# Altium footprint library connectors.PcbLib: 256 footprints (part 15 of 16)
Each footprint in its own frame and in the unit in brackets; x right, y up, seen from the top. Pads: shape width x height; smd on the part's side, far side on the other; paste and mask are expansions set on the pad; w line width, h text height; cw(c..) or ccw(c..) is an arc to the next point about the centre after c.
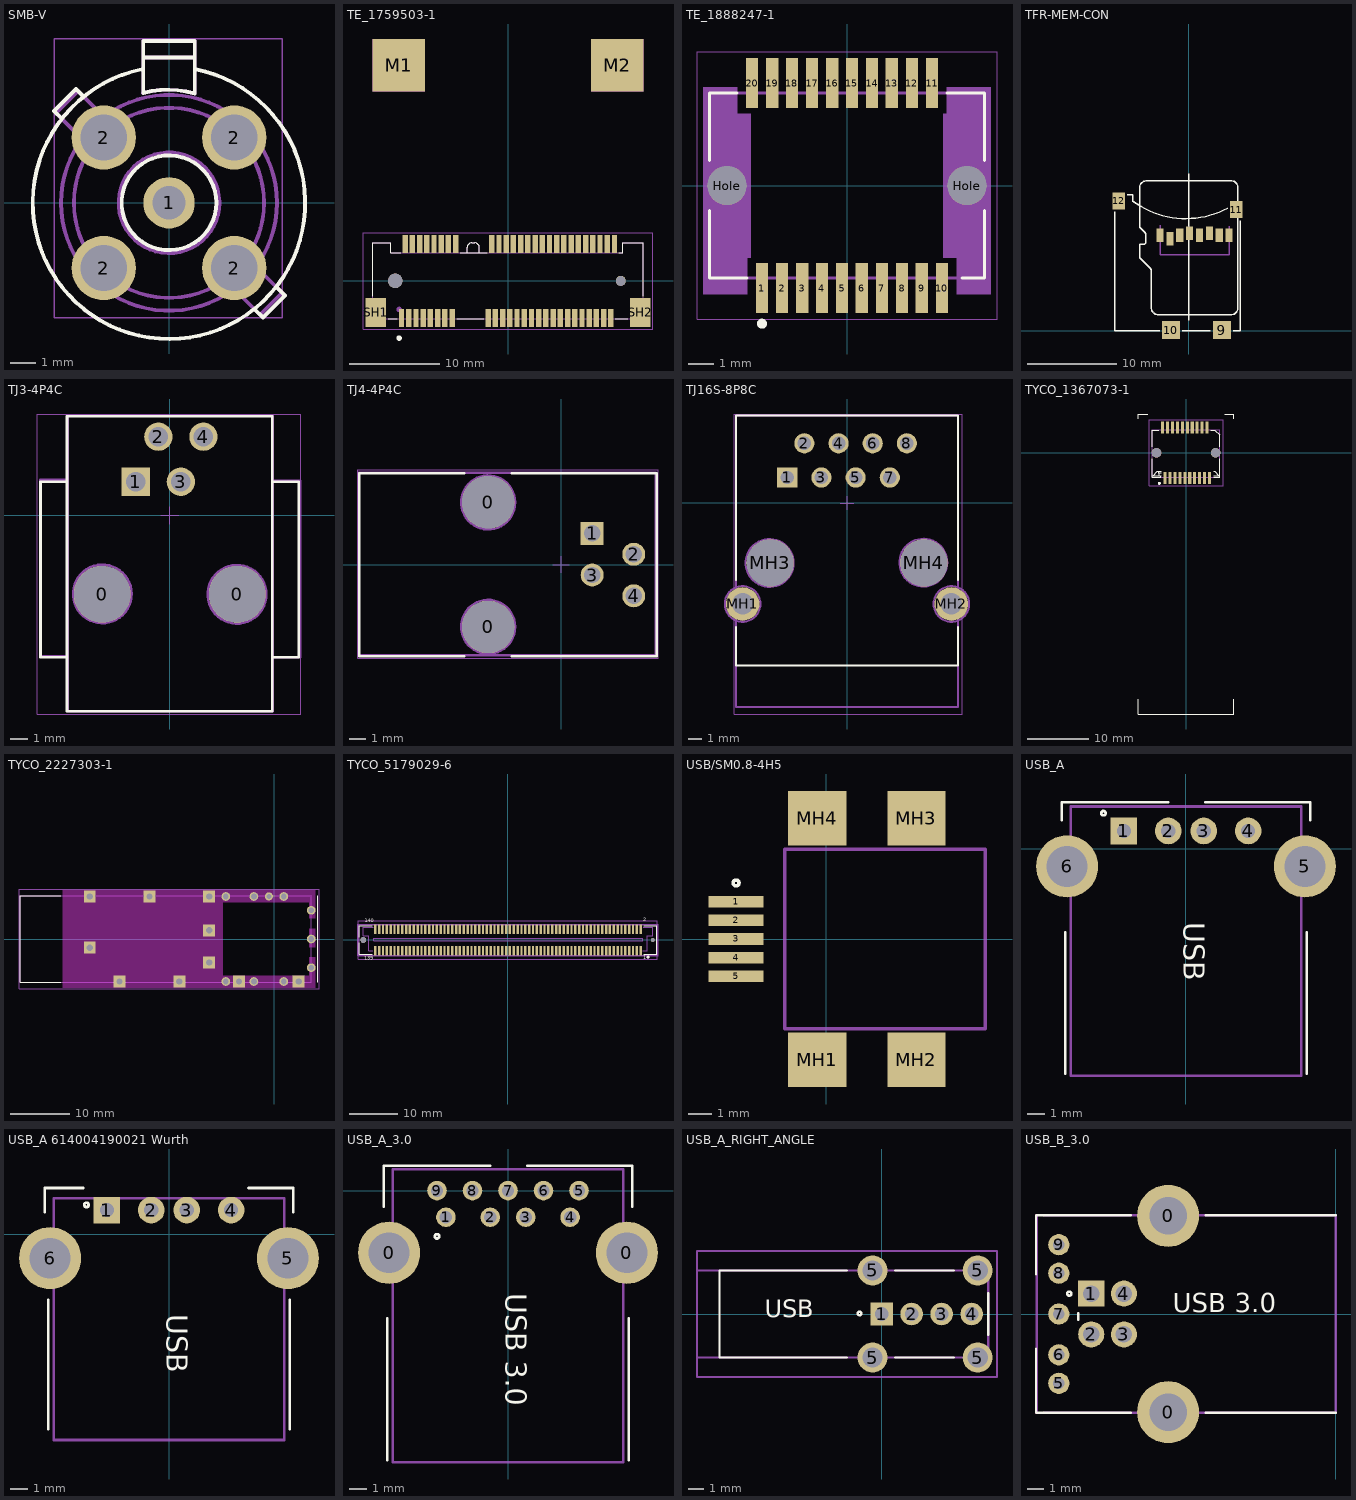
[diagram p14: the footprints below, top view; thin cyan lines are the x and y axes]

## SMB-V [mm] "73403-5072 molex Fakra II"
height 18
pads (5):
  round 2 hole 1.3: 1(0,0)
  round 2.5 hole 1.8: 2(-2.54,-2.54) 2(-2.54,2.54) 2(2.54,-2.54) 2(2.54,2.54)
Top Overlay:
  circle w0.15: c0,0 r1.844
  lines w0.15: -4.175,3.275 -4.475,3.575 -3.618,4.432 -3.343,4.157 ; -1.058,5.194 ccw(c0,0) 1.006,5.205 ; -1,4.278 cw(c-0.041,0.562) 1.002,4.256 ; -1,4.277 -1,6.3 1,6.3 1,4.256 ; -1,5.65 0.975,5.65 ; 3.318,-4.132 3.655,-4.47 4.512,-3.612 4.2,-3.3
TopAssy 13:
  circle w0.15: c0,0 r4.201
  circle w0.15: c0,0 r3.7
  circle w0.15: c0,0 r0.214
  lines w0.15: -3.012,2.113 -4.4,3.5 -3.543,4.357 -2.155,2.97 ; -1.007,4.277 cw(c-0.041,0.562) 1.002,4.256 ; -1,4.277 -1,6.3 1,6.3 1,4.25 ; -1,5.65 1,5.65 ; 1.96,0 cw(c0,0) 1.96,0.051 ; 2.168,-2.982 3.543,-4.357 4.4,-3.5 3.025,-2.125
TopCourt 15:
  lines w0.05: -4.475,-4.475 4.4,-4.475 4.4,6.375 -4.475,6.375 -4.475,-4.475
3D body "734035072.stp": height 15.8, standoff -2.76, extent -4.343,-4.343 4.293,6.224

## TE_1759503-1 [mm]
pads (58):
  rect 0.6x2 smd: 1(-11.8,-4.1) 2(-11.4,4.1) 3(-11,-4.1) 4(-10.6,4.1) 5(-10.2,-4.1) 6(-9.8,4.1) 7(-9.4,-4.1) 8(-9,4.1) 9(-8.6,-4.1) 10(-8.2,4.1) 11(-7.8,-4.1) 12(-7.4,4.1) 13(-7,-4.1) 14(-6.6,4.1) 15(-6.2,-4.1) 16(-5.8,4.1) 17(-2.2,-4.1) 18(-1.8,4.1) 19(-1.4,-4.1) 20(-1,4.1) 21(-0.6,-4.1) 22(-0.2,4.1) 23(0.2,-4.1) 24(0.6,4.1) 25(1,-4.1) 26(1.4,4.1) 27(1.8,-4.1) 28(2.2,4.1) 29(2.6,-4.1) 30(3,4.1) 31(3.4,-4.1) 32(3.8,4.1) 33(4.2,-4.1) 34(4.6,4.1) 35(5,-4.1) 36(5.4,4.1) 37(5.8,-4.1) 38(6.2,4.1) 39(6.6,-4.1) 40(7,4.1) 41(7.4,-4.1) 42(7.8,4.1) 43(8.2,-4.1) 44(8.6,4.1) 45(9,-4.1) 46(9.4,4.1) 47(9.8,-4.1) 48(10.2,4.1) 49(10.6,-4.1) 50(11,4.1) 51(11.4,-4.1) 52(11.8,4.1)
  rect 5.8x5.8 smd: M1(-12.1,23.9) M2(12.1,23.9)
  round 1.6 hole 1.6 unplated: None(-12.5,0)
  round 1.1 hole 1.1 unplated: None(12.5,0)
  rect 2.3x3.2 smd: SH1(-14.65,-3.5) SH2(14.65,-3.5)
Top Overlay:
  circle w0.4: c-12.065,-6.35 r0.1
  lines w0.127: -15,-1.7 -15,4.2 -13,4.2 -13,3.1 -11.9,3.1 ; -13.3,-4.2 -12.3,-4.2 ; -5.7,-4.2 -2.7,-4.2 ; -5.3,3.1 -4.535,3.1 ; -4.535,3.7 -4.535,3.1 ; -4.535,3.701 cw(c-4.018,3.682) -3.999,4.2 ; -4,4.2 -3.7,4.2 ; -3.701,4.2 cw(c-3.682,3.682) -3.165,3.701 ; -3.165,3.7 -3.165,3.1 ; -2.3,3.1 -3.165,3.1 ; 11.9,-4.2 13.3,-4.2 ; 12.3,3.1 12.7,3.1 12.7,4.2 15,4.2 15,-1.7 ; -4.535,3.1 -3.165,3.1
Keep-Out Layer:
  region: -15.005,26.8 -9.2,26.8 -9.2,21.007 -15.005,21.007
  region: 9.202,26.8 15,26.8 15,21.004 9.202,21.004
  region: -15.005,26.8 -9.2,26.8 -9.2,21.007 -15.005,21.007
  region: 9.202,26.8 15,26.8 15,21.004 9.202,21.004
  region: -15.005,26.8 -9.2,26.8 -9.2,21.007 -15.005,21.007
  region: 9.202,26.8 15,26.8 15,21.004 9.202,21.004
TopAssy 13:
  circle w0.4: c-12.065,-3.175 r0.1
  circle w0.4: c-12.065,-3.175 r0.1
  lines w0.127: -15,-4.2 15,-4.2 ; -15,-4.2 -15,4.2 ; -15,-4.2 15,-4.2 ; -15,-4.2 -15,4.2 ; -15,4.2 -13,4.2 ; -15,4.2 -13,4.2 ; -13,3.1 -13,4.2 ; -13,3.1 -4.535,3.1 ; -13,3.1 -13,4.2 ; -13,3.1 -4.535,3.1 ; -4.535,3.1 -3.165,3.1 ; -4.535,3.1 -4.535,3.7 -4.535,3.1 ; -4.535,3.1 -3.165,3.1 ; -3.165,3.1 12.7,3.1 ; -3.165,3.1 -3.165,3.7 -3.165,3.1 ; -3.165,3.1 12.7,3.1 ; 12.7,3.1 12.7,4.2 ; 12.7,3.1 12.7,4.2 ; 12.7,4.2 15,4.2 ; 12.7,4.2 15,4.2 ; 15,-4.2 15,4.2 ; 15,-4.2 15,4.2 ; -4.535,3.701 cw(c-4.018,3.682) -3.999,4.2 ccw(c-4.018,3.682) -4.535,3.701 ; -4,4.2 -3.7,4.2 -4,4.2 ; -3.701,4.2 cw(c-3.682,3.682) -3.165,3.701 ccw(c-3.682,3.682) -3.701,4.2
TopCourt 15:
  region: -15.001,26.8 -9.2,26.8 -9.2,21.002 -15.001,21.002
  region: 9.212,26.8 15,26.8 15,21.028 9.212,21.028
  lines w0.05: -16.05,-5.35 16.05,-5.35 16.05,5.35 -16.05,5.35 -16.05,-5.35
3D body "c-1759503-1-d-3d.stp": height 8.04, standoff -0.87, extent -15,-4.618 15,4.825

## TE_1888247-1 [mm]
pads (22):
  rect 0.5x2 smd mask+0: 1(-3.4,-4.1) 2(-2.6,-4.1) 3(-1.8,-4.1) 4(-1,-4.1) 5(-0.2,-4.1) 6(0.6,-4.1) 7(1.4,-4.1) 8(2.2,-4.1) 9(3,-4.1) 10(3.8,-4.1) 11(3.4,4.1) 12(2.6,4.1) 13(1.8,4.1) 14(1,4.1) 15(0.2,4.1) 16(-0.6,4.1) 17(-1.4,4.1) 18(-2.2,4.1) 19(-3,4.1) 20(-3.8,4.1)
  round 1.55 hole 1.55 paste-1.55 mask+0: Hole(-4.8,0) Hole(4.8,0)
Top Overlay:
  circle w0.2: c-3.4,-5.527 r0.1
  lines w0.127: -5.5,-1 -5.5,-3.7 -4,-3.7 ; -5.5,1 -5.5,3.7 -4.4,3.7 ; 4,3.7 5.5,3.7 5.5,1 ; 4.6,-3.7 5.5,-3.7 5.5,-1
Bottom3D 2:
  region: -4.39,-4.345 -5.756,-4.345 -5.756,3.94 -4.39,3.94
  region: -3.85,-2.882 -4.393,-2.882 -4.393,2.88 -3.85,2.88
  region: -3.99,-4.341 -4.391,-4.341 -4.391,-2.88 -3.99,-2.88
  region: 4.39,2.885 3.997,2.885 3.997,3.94 4.39,3.94
  region: 5.75,-4.342 4.392,-4.342 4.392,3.94 5.75,3.94
  region: 4.39,-2.886 3.858,-2.886 3.858,2.88 4.39,2.88
  region: -4.39,-4.347 -5.759,-4.347 -5.759,3.94 -4.39,3.94
  region: -3.85,-2.883 -4.395,-2.883 -4.395,2.88 -3.85,2.88
  region: -3.99,-4.342 -4.392,-4.342 -4.392,-2.88 -3.99,-2.88
  region: 4.39,2.885 3.998,2.885 3.998,3.94 4.39,3.94
  region: 5.75,-4.348 4.398,-4.348 4.398,3.94 5.75,3.94
  region: 4.39,-2.88 3.85,-2.88 3.85,2.88 4.39,2.88
Mechanical 8:
  lines w0.05: -6,-5.35 6,-5.35 6,5.35 -6,5.35 -6,-5.35
Mechanical 9:
  lines w0.127: -5.5,-3.7 5.5,-3.7 5.5,3.7 -5.5,3.7 -5.5,-3.7

## TFR-MEM-CON [mm]
pads (12):
  rect 0.8x1.5 smd: 1(-3.2,10.7) 2(-2.1,10.3) 3(-1,10.7) 4(0.1,10.9) 5(1.2,10.7) 6(2.3,10.9) 7(3.4,10.7) 8(4.5,10.7)
  rect 2x2 smd: 9(3.7,0.1) 10(-2,0.1)
  rect 1.4x1.9 smd: 11(5.3,13.55) 12(-7.85,14.55)
Top Overlay:
  lines w0.15: -8.25,13.3 -8.25,0 -3.25,0 ; -6.9,15.2 -6.25,15.2 -6.25,14.5 ccw(c-0.309,22.595) 4.35,13.7 ; -4.8,9.9 cw(c-5,9.9) -5,9.7 -5.4,9.7 ccw(c-5.4,9.6) -5.5,9.6 -5.5,8.366 ccw(c-5.1,8.366) -5.383,8.083 -4.317,7.017 cw(c-4.6,6.734) -4.2,6.734 -4.2,2.6 ccw(c-3.4,2.6) -3.4,1.8 4.7,1.8 ccw(c4.7,2.6) 5.5,2.6 5.5,16 ccw(c4.7,16) 4.7,16.8 -4.7,16.8 ccw(c-4.7,16) -5.5,16 -5.5,11.6 -4.917,11.017 cw(c-5.2,10.734) -4.8,10.734 -4.8,9.9 ; -0.75,0 2.4,0 ; 0,1.2 0,17.6 ; 5,0 5.75,0 5.75,12.3
Bottom3D 2:
  lines w0.15: -3.2,11.8 -3.2,8.5 4.5,8.5 4.5,11.7

## TJ3-4P4C [mm] "Гнездо на плату, прямое"
height 16.5
pads (6):
  round 3.2 hole 3.2: 0(-3.81,-4.445) 0(3.81,-4.445)
  rect 1.6x1.6 hole 1.1: 1(-1.905,1.905)
  round 1.6 hole 1.1: 2(-0.635,4.445) 3(0.635,1.905) 4(1.905,4.445)
Top Overlay:
  lines w0.15: -5.791,-8.001 -7.29,-8.001 -7.29,1.905 -5.791,1.905 ; 5.791,-8.001 7.29,-8.001 7.29,1.905 5.791,1.905 ; -5.791,-11.045 5.791,-11.045 5.791,5.605 -5.791,5.605 -5.791,-11.045
TopAssy 13:
  circle w0.15: c-3.8,-4.425 r1.65
  circle w0.15: c3.8,-4.45 r1.65
  lines w0.15: -5.75,-7.95 -7.3,-7.95 -7.3,2 -5.75,2 ; 5.825,-8 7.375,-8 7.375,1.95 5.825,1.95 ; -5.75,-11.05 5.825,-11.05 5.825,5.65 -5.75,5.65 -5.75,-11.05 ; -2.475,1.4 -1.375,1.4 -1.375,2.525 -2.475,2.525 -2.475,1.4
TopCourt 15:
  lines w0.05: -0.5,0 0.5,0 ; 0,-0.5 0,0.5 ; -7.475,-11.2 7.4,-11.2 7.4,5.725 -7.475,5.725 -7.475,-11.2
3D body "Mod-Jack-K122009004-Stig-W.STEP": height 16.38, standoff -3.95, extent -6.985,-10.945 6.985,4.935

## TJ4-4P4C [mm] "Гнездо на плату, угловое"
height 11.5
pads (6):
  round 3.2 hole 3.2 unplated: 0(-4.445,-3.81) 0(-4.445,3.81)
  rect 1.4x1.4 hole 1: 1(1.905,1.905)
  round 1.4 hole 1: 2(4.445,0.635) 3(1.905,-0.635) 4(4.445,-1.905)
Top Overlay:
  lines w0.15: -5.895,-5.588 -12.319,-5.588 -12.319,5.588 -5.895,5.588 ; -2.995,-5.588 5.842,-5.588 5.842,5.588 -2.995,5.588
TopAssy 13:
  circle w0.15: c-4.45,-3.8 r1.65
  circle w0.15: c-4.45,3.8 r1.65
  lines w0.15: -12.35,-5.55 5.8,-5.55 5.8,5.625 -12.35,5.625 -12.35,-5.55 ; 1.375,1.375 2.5,1.375 2.5,2.475 1.375,2.475 1.375,1.375
TopCourt 15:
  lines w0.05: -0.5,0 0.5,0 ; 0,-0.5 0,0.5 ; -12.4,-5.725 5.925,-5.725 5.925,5.8 -12.4,5.8 -12.4,-5.725
3D body "c-0215875-01-r-3d.stp": height 11.5, standoff -3.2, extent -12.355,-5.6 5.745,5.6

## TJ16S-8P8C [mm] "розетка на плату  RJ-45-8pin-socket"
height 10
pads (12):
  rect 1.5x1.5 hole 1: 1(-4.44,1.875)
  round 1.5 hole 1: 2(-3.17,4.415) 3(-1.9,1.875) 4(-0.63,4.415) 5(0.64,1.875) 6(1.91,4.415) 7(3.18,1.875) 8(4.45,4.415)
  round 2.5 hole 1.6: MH1(-7.76,-7.525) MH2(7.76,-7.525)
  round 3.5 hole 3.5 unplated: MH3(-5.71,-4.475) MH4(5.72,-4.475)
Top Overlay:
  lines w0.15: -8.25,-9.25 -8.25,-12.095 8.26,-12.095 8.26,-9.25 ; -8.25,-5.75 -8.25,6.5 8.26,6.5 8.26,-5.75
TopAssy 13:
  circle w0.15: c7.76,-7.525 r1.326
  circle w0.15: c-7.76,-7.525 r1.326
  circle w0.15: c-5.75,-4.48 r1.782
  circle w0.15: c5.675,-4.455 r1.782
  lines w0.15: -8.25,-15.2 -8.25,-3.205 -8.25,6.5 8.26,6.5 8.26,-3.205 8.26,-15.2 -8.25,-15.2
TopCourt 15:
  lines w0.05: -0.5,-0.03 0.5,-0.03 ; 0,-0.53 0,0.47 ; -8.375,-15.705 -8.375,6.595 8.55,6.595 8.55,-15.705 -8.375,-15.705
3D body "User Library-RJ-45 (TJ7-8P8C).step": height 13.7, standoff -4, extent -7.9,-15.23 8.1,6.17

## TYCO_1367073-1 [mm] "SFP/SFP+/zSFP+, Connector, Data Rate (Max) 4 Gb/s, SFP, Surface Mount, Cable-to-Board, 20 Position, .8mm [.031in] Centerline TYCO_1367073-1"
pads (22):
  rect 0.5x2 smd mask+0: 1(-3.4,-4.1) 2(-2.6,-4.1) 3(-1.8,-4.1) 4(-1,-4.1) 5(-0.2,-4.1) 6(0.6,-4.1) 7(1.4,-4.1) 8(2.2,-4.1) 9(3,-4.1) 10(3.8,-4.1) 11(3.4,4.1) 12(2.6,4.1) 13(1.8,4.1) 14(1,4.1) 15(0.2,4.1) 16(-0.6,4.1) 17(-1.4,4.1) 18(-2.2,4.1) 19(-3,4.1) 20(-3.8,4.1)
  round 1.55 hole 1.55 paste-1.55 mask+0: Hole(-4.8,0) Hole(4.8,0)
Top Overlay:
  circle w0.25: c-4.331,-4.959 r0.125
  lines w0.2: -7.787,-40.003 -7.787,-42.404 7.761,-42.404 7.761,-40.003 ; -7.787,5.497 -7.787,6.297 -6.25,6.297 ; -5.508,-3.703 -4.058,-3.703 ; -5.508,-0.947 -5.508,-4.003 -4.108,-4.003 -4.108,-3.703 ; -5.508,0.94 -5.508,3.697 -4.458,3.697 ; -5.308,-3.703 -4.708,-2.983 -4.058,-2.983 ; -4.508,-2.983 -4.445,-3.703 ; -4.487,-3.227 -4.058,-3.227 ; 4.042,3.697 4.692,3.697 5.492,2.897 5.492,0.94 ; 4.492,-4.003 5.492,-4.003 5.492,-0.947 ; 4.492,-3.703 5.492,-3.703 ; 4.492,-2.983 4.692,-2.983 5.292,-3.703 ; 6.25,6.297 7.761,6.297 7.761,5.497
TopAssy 13:
  lines w0.127: -5.5,-4 -5.5,3.7 5.5,3.7 5.5,-4 -5.5,-4
TopCourt 15:
  lines w0.05: -6,-5.35 6,-5.35 6,5.35 -6,5.35 -6,-5.35
3D body "c-1367073-1-f3-3d.stp": height 5.21, standoff -0.79, extent -5.5,-4.5 5.5,4.5

## TYCO_2227303-1 [mm] "SFP/SFP+/zSFP+, Cage, Data Rate (Max) 4 Gb/s, External Springs, SFP, Port Matrix Configuration 1 x 1, Through Hole - Press-Fit, 1 Port"
pads (20):
  round 1.358 hole 0.85: S1(-0.9,7.125)
  round 1.458 hole 0.95: S2(1.6,7.125) S3(-3.4,7.125) S4(-8.1,7.125) S5(6.2,4.8) S6(6.2,0) S7(6.2,-4.8) S8(1.6,-7.125) S9(-3.4,-7.125) S10(-8.1,-7.125)
  rect 2x2 hole 1.05: S11(-10.9,7.125) S12(-20.9,7.125) S13(-30.9,7.125) S14(-10.9,1.45) S15(-30.9,-1.45) S16(-10.9,-3.95) S17(-25.9,-7.125) S18(-15.9,-7.125) S19(-5.9,-7.125) S20(4.1,-7.125)
Top Layer keep-out:
  region: 6.9,-1.355 5.9,-1.355 5.9,1.745 6.9,1.745
  region: 6.9,3.445 5.9,3.445 5.9,6.125 -8.6,6.125 -8.6,-6.125 5.9,-6.125 5.9,-3.055 6.9,-3.055 6.9,-8.125 -35.4,-8.125 -35.4,8.125 6.9,8.125
Top Overlay:
  lines w0.127: -35.75,-7.25 -42.5,-7.25 -42.5,7.25 -35.75,7.25 ; 7.25,-7.25 7.25,7.25
TopAssy 13:
  lines w0.127: -42.5,-7.25 6.2,-7.25 6.2,7.25 -42.5,7.25 -42.5,-7.25
TopCourt 15:
  lines w0.05: -42.75,-8.375 7.5,-8.375 7.5,8.375 -42.75,8.375 -42.75,-8.375
3D body "c-2227023-1-a-3d.stp": height 10.38, standoff -2.99, extent -42.4,-7.949 6.3,7.895

## TYCO_5179029-6 [mm]
pads (143):
  rect 0.5x2 smd: 1(27.599,-2.2) 2(27.599,2.2) 2(27.599,2.2) 3(26.799,-2.2) 4(26.799,2.2) 5(25.999,-2.2) 6(25.999,2.2) 7(25.199,-2.2) 8(25.199,2.2) 9(24.399,-2.2) 10(24.399,2.2) 11(23.599,-2.2) 12(23.599,2.2) 13(22.799,-2.2) 14(22.799,2.2) 15(21.999,-2.2) 16(21.999,2.2) 17(21.199,-2.2) 18(21.199,2.2) 19(20.399,-2.2) 20(20.399,2.2) 21(19.599,-2.2) 22(19.599,2.2) 23(18.799,-2.2) 24(18.799,2.2) 25(17.999,-2.2) 26(17.999,2.2) 27(17.199,-2.2) 28(17.199,2.2) 29(16.399,-2.2) 30(16.399,2.2) 31(15.599,-2.2) 32(15.599,2.2) 33(14.799,-2.2) 34(14.799,2.2) 35(13.999,-2.2) 36(13.999,2.2) 37(13.199,-2.2) 38(13.199,2.2) 39(12.399,-2.2) 40(12.399,2.2) 41(11.599,-2.2) 42(11.599,2.2) 43(10.799,-2.2) 44(10.799,2.2) 45(9.999,-2.2) 46(9.999,2.2) 47(9.199,-2.2) 48(9.199,2.2) 49(8.399,-2.2) 50(8.399,2.2) 51(7.599,-2.2) 52(7.599,2.2) 53(6.799,-2.2) 54(6.799,2.2) 55(5.999,-2.2) 56(5.999,2.2) 57(5.199,-2.2) 58(5.199,2.2) 59(4.399,-2.2) 60(4.399,2.2) 61(3.599,-2.2) 62(3.599,2.2) 63(2.799,-2.2) 64(2.799,2.2) 65(1.999,-2.2) 66(1.999,2.2) 67(1.199,-2.2) 68(1.199,2.2) 69(0.399,-2.2) 70(0.399,2.2) 71(-0.401,-2.2) 72(-0.401,2.2) 73(-1.201,-2.2) 74(-1.201,2.2) 75(-2.001,-2.2) 76(-2.001,2.2) 77(-2.801,-2.2) 78(-2.801,2.2) 79(-3.601,-2.2) 80(-3.601,2.2) 81(-4.401,-2.2) 82(-4.401,2.2) 83(-5.201,-2.2) 84(-5.201,2.2) 85(-6.001,-2.2) 86(-6.001,2.2) 87(-6.801,-2.2) 88(-6.801,2.2) 89(-7.601,-2.2) 90(-7.601,2.2) 91(-8.401,-2.2) 92(-8.401,2.2) 93(-9.201,-2.2) 94(-9.201,2.2) 95(-10.001,-2.2) 96(-10.001,2.2) 97(-10.801,-2.2) 98(-10.801,2.2) 99(-11.601,-2.2) 100(-11.601,2.2) 101(-12.401,-2.2) 102(-12.401,2.2) 103(-13.201,-2.2) 104(-13.201,2.2) 105(-14.001,-2.2) 106(-14.001,2.2) 107(-14.801,-2.2) 108(-14.801,2.2) 109(-15.601,-2.2) 110(-15.601,2.2) 111(-16.401,-2.2) 112(-16.401,2.2) 113(-17.201,-2.2) 114(-17.201,2.2) 115(-18.001,-2.2) 116(-18.001,2.2) 117(-18.801,-2.2) 118(-18.801,2.2) 119(-19.601,-2.2) 120(-19.601,2.2) 121(-20.401,-2.2) 122(-20.401,2.2) 123(-21.201,-2.2) 124(-21.201,2.2) 125(-22.001,-2.2) 126(-22.001,2.2) 127(-22.801,-2.2) 128(-22.801,2.2) 129(-23.601,-2.2) 130(-23.601,2.2) 131(-24.401,-2.2) 132(-24.401,2.2) 133(-25.201,-2.2) 134(-25.201,2.2) 135(-26.001,-2.2) 136(-26.001,2.2) 137(-26.801,-2.2) 138(-26.801,2.2) 139(-27.601,-2.2) 140(-27.601,2.2)
  round 0.8 hole 0.8 unplated: 141(30.1,0)
  round 1.2 hole 1.2 unplated: 142(-30.1,0)
Top Overlay:
  circle w0.3: c29.14,-3.543 r0.15
  lines w0.152: -30.905,0.6 -30.905,3 -28.2,3 ; -30.9,-0.6 -30.9,-3 -28.2,-3 ; 28.198,-3 30.898,-3 30.898,3 28.198,3
  text "2" at 28.125,3.563 h1.27
  text "140" at -29.818,3.365 h1.27
  text "139" at -29.927,-4.424 h1.27
  text "1" at 28.117,-4.311 h1.27
TopAssy 13:
  circle w0.3: c29.14,-3.543 r0.15
  lines w0.025: -30.9,-3.2 30.898,-3.2 30.898,3.2 -30.9,3.2 -30.9,-3.2
  lines w0.2: -28.1,-2.2 -29,-2.2 -29,0.9 -30.1,0.9 -30.1,2.6 -28,2.6 ; 28,-2.2 29,-2.2 29,0.9 30.1,0.9 30.1,2.6 28.1,2.6 ; -31.2,-3.3 31.2,-3.3 31.2,3.3 -31.2,3.3 -31.2,-3.3 ; -27.9,-0.2 28,-0.2 28,0.4 -27.9,0.4 -27.9,-0.2
  text "2" at 28.125,3.563 h1.27
  text "140" at -29.818,3.365 h1.27
  text "139" at -29.927,-4.424 h1.27
  text "1" at 28.117,-4.311 h1.27
TopCourt 15:
  lines w0.05: -31.1,-4.002 31.096,-4.002 31.096,3.998 -31.1,3.998 -31.1,-4.002
3D body "c-5179029-6-b-3d.stp": height 5.61, standoff -0.99, extent -30.9,-3 30.9,3

## USB/SM0.8-4H5 [mm] "Connector; USB Mini-B, Sinking Type, SM; 5 Position; Right Angle"
height 0.65
pads (9):
  rect 2.35x0.5 smd: 1(-3.862,1.6) 2(-3.862,0.8) 3(-3.862,0) 4(-3.862,-0.8) 5(-3.862,-1.6)
  rect 2.5x2.35 smd: MH1(-0.387,-5.175) MH2(3.863,-5.175) MH3(3.863,5.175) MH4(-0.387,5.175)
Top Overlay:
  circle w0.15: c-3.862,2.4 r0.125
TopAssy 13:
  lines w0.15: -1.788,-3.85 -1.788,3.85 6.813,3.85 6.813,-3.85 -1.788,-3.85
3D body: height 0.65, standoff -3.25, extent -1.798,-3.838 6.801,3.861

## USB_A [mm] "Connector; USB, Type A, Thru-Hole; Right Angle"
height 10.95
pads (6):
  rect 1.5x1.5 hole 0.8: 1(-3.5,1)
  round 1.5 hole 0.8: 2(-1,1) 3(1,1) 4(3.5,1)
  round 3.5 hole 2.3: 5(6.7,-1) 6(-6.7,-1)
Top Overlay:
  circle w0.15: c-4.65,2 r0.125
  lines w0.15: -7,1.6 -7,2.625 -1,2.625 ; -6.8,-12.68 -6.8,-4.7 ; 1.1,2.625 7,2.625 7,1.6 ; 6.8,-12.68 6.8,-4.7
  text "USB" at -0.525,-4.15 h2
TopAssy 13:
  lines w0.15: -6.5,-12.8 -6.5,2.375 6.5,2.375 6.5,-12.8 -6.5,-12.8
3D body "User Library-USB-A-01.step": height 7, standoff -4.15, extent -7.9,-11.475 7.9,2.225

## USB_A 614004190021 Wurth [mm] "Connector; USB, Type A, Thru-Hole; Right Angle, 614004190021 Wurth"
height 10.95
pads (6):
  rect 1.5x1.5 hole 0.8: 1(-3.5,1.355)
  round 1.5 hole 0.8: 2(-1,1.355) 3(1,1.355) 4(3.5,1.355)
  round 3.5 hole 2.3: 5(6.7,-1.355) 6(-6.7,-1.355)
Top Overlay:
  circle w0.15: c-4.65,1.645 r0.125
  lines w0.15: -7,1.245 -7,2.6 -4.825,2.6 ; -6.8,-11 -6.8,-3.7 ; 4.475,2.6 7,2.6 7,1.245 ; 6.8,-11 6.8,-3.7
  text "USB" at -0.525,-4.505 h2
TopAssy 13:
  lines w0.15: -6.5,-11.6 -6.5,2.02 6.5,2.02 6.5,-11.6 -6.5,-11.6
3D body "STEP-614004190021-rev1.stp": height 7.7, standoff -3.7, extent -7.85,-11.655 7.85,2.495

## USB_A_3.0 [mm] "Connector; USB3.0, Type A, Thru-Hole; Right Angle"
height 10.95
pads (11):
  round 3.5 hole 2.3: 0(-6.7,-3.5) 0(6.7,-3.5)
  round 1.1 hole 0.7: 1(-3.5,-1.5) 2(-1,-1.5) 3(1,-1.5) 4(3.5,-1.5) 5(4,0) 6(2,0) 7(0,0) 8(-2,0) 9(-4,0)
Top Overlay:
  circle w0.15: c-4,-2.575 r0.125
  lines w0.15: -7,-0.9 -7,1.4 -1,1.4 ; -6.8,-15.18 -6.8,-7.2 ; 1.1,1.4 7,1.4 7,-0.9 ; 6.8,-15.18 6.8,-7.2
  text "USB 3.0" at -0.525,-5.775 h2
TopAssy 13:
  lines w0.15: -6.5,-15.3 6.5,-15.3 6.5,1.2 -6.5,1.2 -6.5,-15.3
  text "PCB Edge" at -5.6,-15.1 h0.96
3D body "usb3_a-usb3_a.stp": height 7.7, standoff -2.96, extent -7.8,-15.3 7.8,1.2

## USB_A_RIGHT_ANGLE [mm] "Connector; USB, Type A, Thru-Hole; Right Angle, DS1095-01"
height 14.5
pads (8):
  rect 1.5x1.5 hole 0.9: 1(0,0)
  round 1.5 hole 0.9: 2(2,0) 3(4,0) 4(6,0)
  round 2 hole 1.35: 5(-0.6,-2.9) 5(-0.6,2.9) 5(6.4,-2.9) 5(6.4,2.9)
Top Overlay:
  circle w0.15: c-1.47,0.04 r0.125
  lines w0.15: -2.3,-2.9 -10.8,-2.9 -10.8,2.9 -2.3,2.9 ; 0.89,-2.9 4.8,-2.9 ; 0.89,2.9 4.8,2.9 ; 7.1,-1.4 7.1,0 7.1,1.4
  text "USB" at -7.77,-0.62 h2
TopAssy 13:
  lines w0.15: -12.3,-2.9 7.1,-2.9 7.1,2.9 -12.3,2.9 -12.3,-2.9
TopCourt 15:
  lines w0.15: -12.3,-4.2 7.69,-4.2 7.69,4.2 -12.3,4.2 -12.3,-4.2
3D body "14379.stp": height 14.55, standoff -3.6, extent -12.249,-3.561 7.001,3.559

## USB_B_3.0 [mm] "Connector; USB3.0, Type B, Thru-Hole; Right Angle"
height 10.95
pads (11):
  round 3.8 hole 2.3: 0(-10.3,-6.02) 0(-10.3,6.02)
  rect 1.6x1.6 hole 1: 1(-15.01,1.25)
  round 1.6 hole 1: 2(-15.01,-1.25) 3(-13.01,-1.25) 4(-13.01,1.25)
  round 1.3 hole 0.7: 5(-17,-4.25) 6(-17,-2.5) 7(-17,0) 8(-17,2.5) 9(-17,4.25)
Top Overlay:
  circle w0.15: c-16.36,1.25 r0.125
  lines w0.15: -18.4,-2.14 -18.4,-6.05 -12.6,-6.05 ; -18.4,2.45 -18.4,6.05 -12.6,6.05 ; -15.82,-0.36 -15.82,0.05 ; -8,-6.05 -0.02,-6.05 ; -8,6.05 -0.02,6.05
  text "USB 3.0" at -10,-0.3 h2
TopAssy 13:
  lines w0.15: -18.35,-6.05 -18.35,6.05 ; -17.9,-6.05 -0.02,-6.05 -0.02,6.05 -17.9,6.05 ; 0,-6.05 0,6.05
  text "PCB Edge" at -0.325,-5.651 h0.96
3D body "usb3_a-usb3_b.stp": height 12.21, standoff -3.17, extent -18.3,-7.2 0,7.2